# Altium footprint library M_Derogarian Altium Library.PcbLib: 137 footprints (part 1 of 9)
Each footprint in its own frame and in the unit in brackets; x right, y up, seen from the top. Pads: shape width x height; smd on the part's side, far side on the other; paste and mask are expansions set on the pad; w line width, h text height; cw(c..) or ccw(c..) is an arc to the next point about the centre after c.
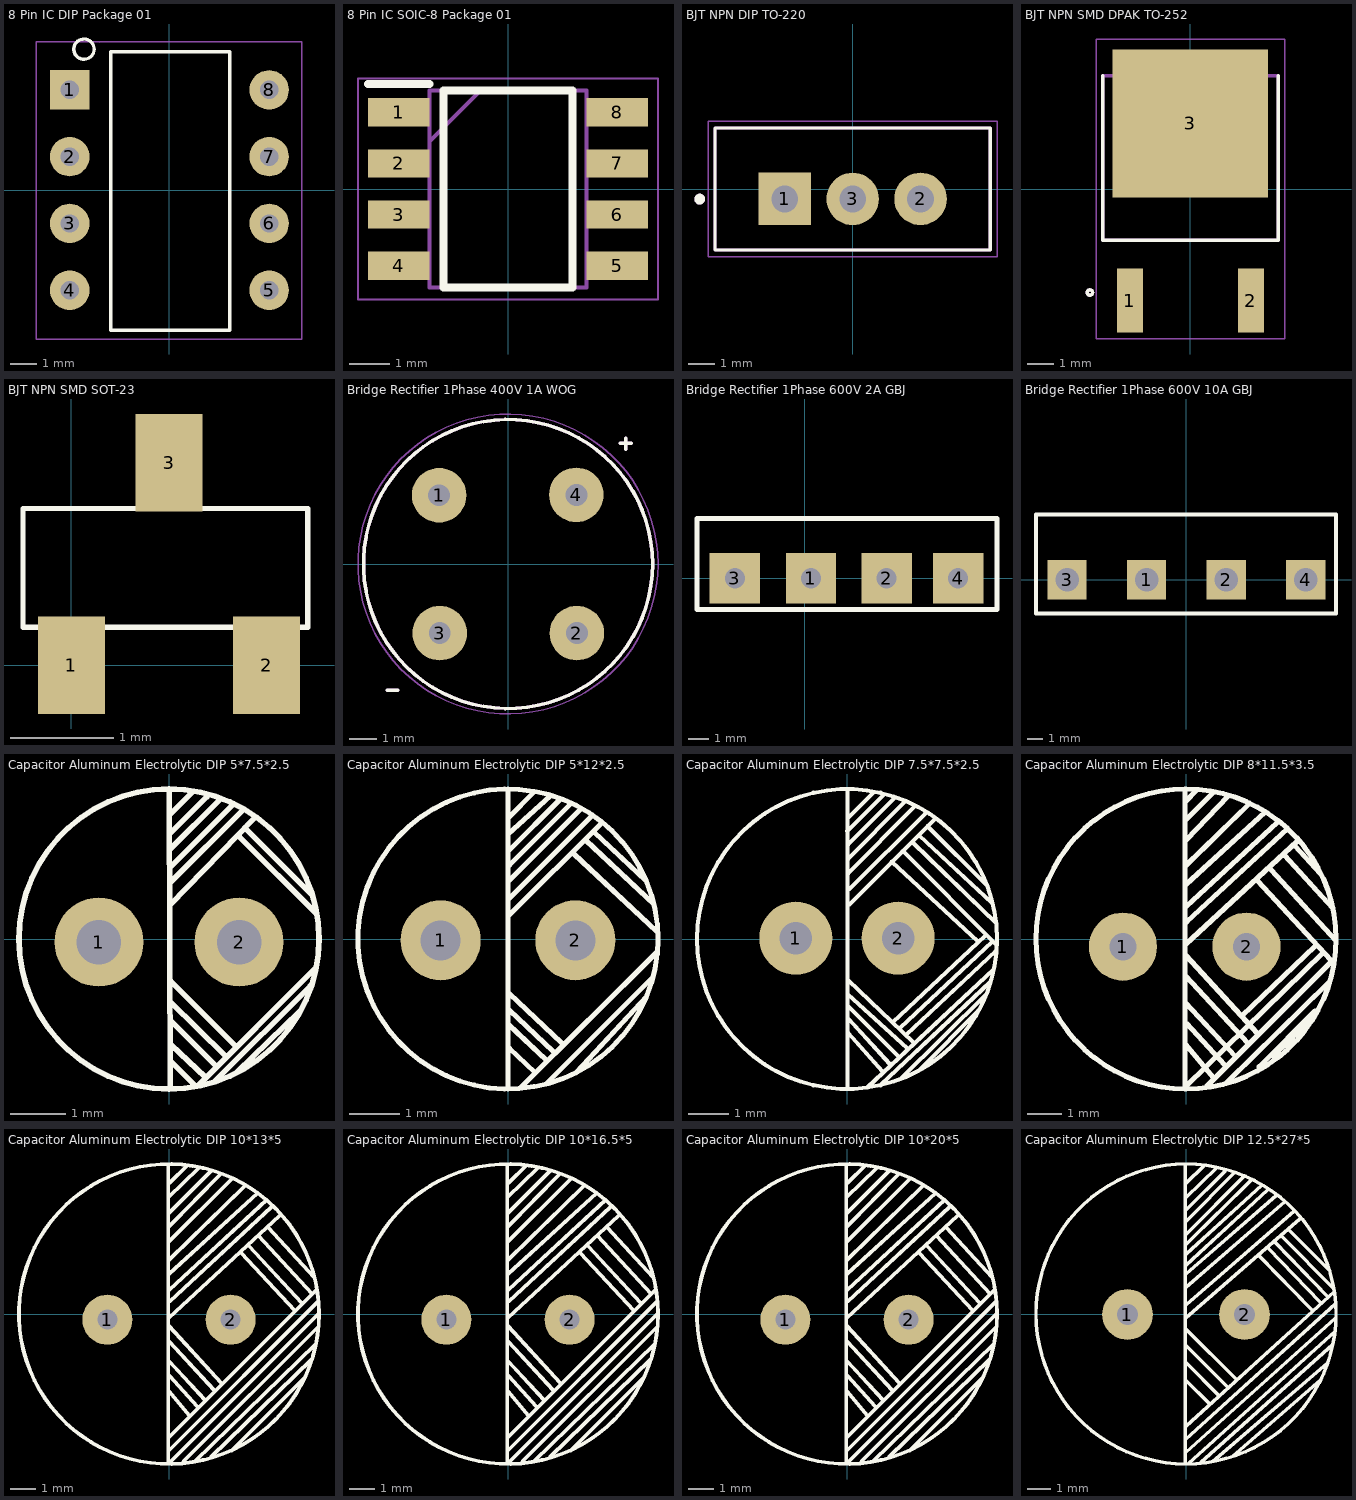
[diagram p0: the footprints below, top view; thin cyan lines are the x and y axes]

## 8 Pin IC DIP Package 01 [mm]
pads (8):
  rect 1.5x1.5 hole 0.7: 1(-3.793,3.81)
  round 1.5 hole 0.7: 2(-3.793,1.27) 3(-3.793,-1.27) 4(-3.793,-3.81) 5(3.793,-3.81) 6(3.793,-1.27) 7(3.793,1.27) 8(3.793,3.81)
Top Overlay:
  circle w0.127: c-3.251,5.359 r0.386
  lines w0.127: 2.269,-5.334 -2.227,-5.334 -2.227,5.258 2.294,5.258 2.294,-5.334
Mechanical 15:
  lines w0.05: -2.674,5.623 -2.659,5.639 ; -5.072,-5.664 5.037,-5.664 5.037,5.639 -5.072,5.639 -5.072,-5.664
3D body "User Library-DIP-8P-M01.STEP": height 4.86, standoff -2.5, extent -3.912,-4.598 3.958,4.802

## 8 Pin IC SOIC-8 Package 01 [mm]
pads (8):
  rect 1.525x0.7 smd: 1(-2.712,1.905) 2(-2.712,0.635) 3(-2.712,-0.635) 4(-2.712,-1.905) 5(2.712,-1.905) 6(2.712,-0.635) 7(2.712,0.635) 8(2.712,1.905)
Top Overlay:
  lines w0.2: -3.475,2.605 -1.95,2.605 ; -1.6,-2.45 1.6,-2.45 1.6,2.45 -1.6,2.45 -1.6,-2.45
Mechanical 13:
  lines w0.05: -3.725,-2.75 3.725,-2.75 3.725,2.75 -3.725,2.75 -3.725,-2.75
  lines w0.1: -1.95,1.18 -0.68,2.45 ; -1.95,-2.45 1.95,-2.45 1.95,2.45 -1.95,2.45 -1.95,-2.45
3D body "User Library-SOIC8_4_9x3_9_1_53_p1_27.STEP": height 1.55, standoff -0.11, extent -3,-2.45 3,2.45

## BJT NPN DIP TO-220 [mm]
pads (3):
  rect 1.965x1.965 hole 1: 1(-2.54,-0.373)
  round 1.965 hole 1: 2(2.54,-0.373) 3(0,-0.373)
Top Overlay:
  circle w0.2: c-5.726,-0.377 r0.1
  lines w0.127: -5.152,-2.282 5.152,-2.282 5.152,2.282 -5.152,2.282 -5.152,-2.282
Mechanical 13:
  circle w0.2: c-5.726,-0.377 r0.1
  lines w0.127: -5.152,-2.282 5.152,-2.282 5.152,2.282 -5.152,2.282 -5.152,-2.282
Mechanical 15:
  lines w0.05: -5.403,-2.532 -5.403,2.532 5.403,2.532 5.403,-2.532 -5.403,-2.532
3D body "STP03D200.STEP": height 22.22, standoff -8.36, extent -5.201,-2.261 5.099,2.311

## BJT NPN SMD DPAK TO-252 [mm]
pads (3):
  rect 0.98x2.4 smd: 1(-2.28,-4.2) 2(2.28,-4.2)
  rect 5.86x5.57 smd paste-4: 3(0,2.47)
Top Overlay:
  circle w0.127: c-3.786,-3.9 r0.1
  lines w0.127: -3.3,4.27 -3.3,-1.93 3.3,-1.93 3.3,4.27
Mechanical 13:
  circle w0.127: c-3.786,-3.9 r0.1
  lines w0.127: -3.3,-1.93 -3.3,4.27 3.3,4.27 3.3,-1.93 -3.3,-1.93
Mechanical 15:
  lines w0.05: -3.55,-5.65 3.55,-5.65 3.55,5.65 -3.55,5.65 -3.55,-5.65
3D body "2STD1665T4.STEP": height 2.17, standoff -0.23, extent -3.25,-4.87 3.25,4.855

## BJT NPN SMD SOT-23 [mm]
pads (3):
  rect 0.65x0.95 smd mask+0.08: 1(0,0) 2(1.9,0) 3(0.95,1.97)
Top Overlay:
  lines w0.05: -0.47,0.37 2.3,0.37 2.3,1.525 -0.47,1.525 -0.47,0.37
3D body "User Library-SOT23-9.STEP": height 1.11, standoff 0.01, extent -0.488,-0.195 2.412,2.205

## Bridge Rectifier 1Phase 400V 1A WOG [mm]
pads (4):
  round 2 hole 0.8: 1(-2.527,2.521) 2(2.527,-2.534) 3(-2.502,-2.534) 4(2.507,2.534)
Top Overlay:
  circle w0.127: c0,0 r5.3
  lines w0.127: -4.433,-4.629 -4.033,-4.629 ; 4.121,4.42 4.521,4.42 ; 4.319,4.213 4.319,4.613
Mechanical 13:
  circle w0.127: c0,0 r5.3
  lines w0.127: -4.433,-4.629 -4.033,-4.629 ; 4.121,4.42 4.521,4.42 ; 4.318,4.213 4.318,4.613
Mechanical 15:
  circle w0.05: c0,0 r5.5
3D body "User Library-WOB-1.STEP": height 7.6, standoff -1.5, extent -4.637,-4.669 4.663,4.631

## Bridge Rectifier 1Phase 600V 2A GBJ [mm]
pads (4):
  rect 2.5x2.5 hole 1: 1(0.305,0) 2(4.064,0) 3(-3.48,0) 4(7.62,0)
Top Overlay:
  lines w0.254: -5.359,-1.549 -5.359,2.972 9.55,2.972 9.55,-1.549 -5.359,-1.549
3D body "User Library-Silicon Bridge Rectifiers KBP06.STEP": height 15.68, standoff -16.67, extent -5.191,-1.256 9.559,2.794

## Bridge Rectifier 1Phase 600V 10A GBJ [mm]
pads (4):
  rect 2.5x2.5 hole 1.5: 1(-2.54,0) 2(2.54,0) 3(-7.62,0) 4(7.62,0)
Top Overlay:
  lines w0.254: -9.601,-2.159 9.55,-2.159 9.55,4.166 -9.601,4.166 -9.601,-2.159
3D body "User Library-KBL-1.STEP": height 16.75, standoff -3.5, extent -9.5,-2.235 9.5,4.015

## Capacitor Aluminum Electrolytic DIP 5*7.5*2.5 [mm]
height 12
pads (2):
  round 1.6 hole 0.8: 1(-1.263,-0.057) 2(1.263,-0.057)
Top Overlay:
  circle w0.1: c0,0 r2.7
  lines w0.1: 0.007,2.667 0.025,-2.692 ; 0.013,1.003 1.346,2.337 ; 0.014,1.612 0.914,2.515 ; 0.018,0.616 1.549,2.184 ; 0.018,2.242 0.438,2.661 ; 0.019,-1.455 0.857,-2.293 ; 0.019,-1.125 1.016,-2.108 ; 0.019,-0.744 1.2,-1.925 ; 0.025,1.295 1.168,2.438 ; 0.025,1.905 0.686,2.565 ; 0.044,-2.217 0.476,-2.648 ; 0.044,-1.912 0.645,-2.478 ; 0.527,-2.635 2.622,-0.539 ; 0.831,-2.559 2.546,-0.844 ; 1.225,-2.392 2.362,-1.295 ; 1.264,1.847 2.647,0.463 ; 1.365,1.999 2.571,0.793
3D body "User Library-CAPAER_D050_L080_P025_W005X030.STEP": height 8.01, standoff -3, extent -2.48,-2.663 2.53,2.337

## Capacitor Aluminum Electrolytic DIP 5*12*2.5 [mm]
height 12
pads (2):
  round 1.6 hole 0.8: 1(-1.346,-0.025) 2(1.346,-0.025)
Top Overlay:
  circle w0.1: c0,0 r3
  lines w0.1: 0,-2.997 0,2.997 ; 0,-1.702 0.772,-2.427 ; 0,0.457 1.872,2.319 ; 0.004,2.102 0.844,2.861 ; 0.011,2.428 0.517,2.937 ; 0.013,0.8 1.689,2.476 ; 0.024,-1.092 1.073,-2.078 ; 0.025,-2.184 0.538,-2.666 ; 0.025,-1.422 0.903,-2.248 ; 0.025,1.168 1.46,2.603 ; 0.025,1.473 1.257,2.705 ; 0.025,1.778 1.029,2.781 ; 0.254,-2.972 2.979,-0.262 ; 0.762,-2.896 2.896,-0.762 ; 1.321,1.702 2.973,0.15 ; 1.372,-2.667 2.774,-1.148 ; 1.549,1.981 2.924,0.69 ; 1.727,2.134 2.762,1.162
3D body "User Library-CAPAER_D063_L125_P025_W005X030.STEP": height 12.51, standoff -3, extent -3.18,-3.176 3.13,3.124

## Capacitor Aluminum Electrolytic DIP 7.5*7.5*2.5 [mm]
height 12
pads (2):
  round 1.8 hole 0.8: 1(-1.263,0.019) 2(1.263,0.019)
Top Overlay:
  circle w0.1: c0,0 r3.7
  lines w0.1: 0.007,2.66 0.895,3.55 ; 0.007,-3.658 0.007,3.658 ; 0.018,1.607 1.651,3.251 ; 0.018,1.962 1.409,3.366 ; 0.018,2.318 1.174,3.474 ; 0.025,-2.311 0.873,-3.268 ; 0.025,-1.956 1.067,-3.099 ; 0.025,-1.651 1.27,-2.896 ; 0.025,-1.372 1.479,-2.689 ; 0.025,-1.016 1.642,-2.55 ; 0.044,0.845 2.165,2.966 ; 0.044,1.226 1.93,3.099 ; 0.044,3.004 0.666,3.626 ; 0.505,-3.657 3.618,-0.749 ; 0.843,-3.586 3.531,-1.067 ; 1.104,1.905 3.233,-0.066 ; 1.117,-2.057 3.415,0.089 ; 1.309,-2.197 3.592,-0.063 ; 1.316,-3.45 3.429,-1.372 ; 1.375,2.171 3.691,-0.144 ; 1.463,-2.353 3.669,-0.292 ; 1.629,2.375 3.683,0.381 ; 1.782,2.552 3.581,0.889 ; 1.796,-3.219 3.25,-1.752 ; 1.985,2.781 3.45,1.316
3D body "User Library-CAPAER_D063_L075_P025_W005X030.STEP": height 7.51, standoff -3, extent -3.206,-3.175 3.104,3.125

## Capacitor Aluminum Electrolytic DIP 8*11.5*3.5 [mm]
height 12
pads (2):
  round 2 hole 0.8: 1(-1.85,-0.225) 2(1.775,-0.225)
Top Overlay:
  circle w0.15: c0,0 r4.4
  lines w0.15: -0.025,-4.4 -0.025,4.4 ; -0.022,3.476 0.8,4.3 ; -0.014,-0.167 3.272,2.872 ; -0.01,-3.084 0.813,-4.064 ; -0.01,-1.865 1.444,-3.437 ; -0.01,-1.078 1.821,-3.057 ; -0.003,4.042 0.298,4.353 ; 0,-0.483 2.102,-2.773 ; 0,1.6 2.326,3.722 ; 0,2.159 1.868,3.982 ; 0,2.896 1.25,4.2 ; 0.008,0.957 2.674,3.422 ; 0.016,-2.475 1.143,-3.708 ; 0.02,-4.294 4.025,-0.4 ; 0.027,0.507 2.982,3.24 ; 0.601,-4.326 4.314,-0.614 ; 1.2,-4.2 4.206,-1.255 ; 1.639,-2.263 3.8,-0.2 ; 2.097,1.714 4.257,-0.622 ; 2.147,-3.747 3.784,-2.11 ; 2.5,2.025 4.4,-0.05 ; 2.548,-3.449 3.6,-2.425 ; 2.886,2.453 4.306,0.905 ; 3.191,2.732 3.944,1.918
3D body "User Library-Cap-EL(8x11_5-3_5).STEP": height 11.5, standoff -3.3, extent -4.1,-4.198 3.902,3.798

## Capacitor Aluminum Electrolytic DIP 10*13*5 [mm]
height 12
pads (2):
  round 2 hole 0.8: 1(-2.464,-0.229) 2(2.464,-0.229)
Top Overlay:
  circle w0.15: c0,0 r6
  lines w0.15: -0.025,-5.918 -0.025,5.944 ; -0.022,4.671 1.179,5.832 ; -0.022,3.476 2.057,5.588 ; -0.014,-0.167 4.434,3.947 ; -0.013,-5.474 5.944,0.483 ; -0.013,-4.94 5.893,0.965 ; -0.01,-3.084 0.813,-4.064 ; -0.01,-1.865 1.444,-3.437 ; -0.01,-1.078 1.821,-3.057 ; -0.003,4.042 1.702,5.74 ; 0,-0.483 2.102,-2.773 ; 0,1.6 3.547,4.836 ; 0,2.159 3.033,5.121 ; 0,2.896 2.527,5.423 ; 0.008,0.957 3.901,4.556 ; 0.013,-5.956 5.969,0 ; 0.016,-2.475 1.143,-3.708 ; 0.015,5.242 0.751,5.955 ; 0.027,0.507 4.104,4.277 ; 0.572,-5.905 5.969,-0.508 ; 1.04,-5.892 5.867,-1.194 ; 1.685,-5.722 5.715,-1.803 ; 2.498,-5.47 5.407,-2.562 ; 2.886,2.453 5.033,0.131 ; 3.191,2.732 5.316,0.433 ; 3.572,3.139 5.732,0.803 ; 3.953,3.469 5.819,1.45
3D body "User Library-Cap-EL(10x13-5).STEP": height 13, standoff -3.3, extent -5,-5.296 5.002,4.696

## Capacitor Aluminum Electrolytic DIP 10*16.5*5 [mm]
height 12
pads (2):
  round 2 hole 0.8: 1(-2.464,-0.229) 2(2.464,-0.229)
Top Overlay:
  circle w0.15: c0,0 r6
  lines w0.15: -0.025,-5.918 -0.025,5.944 ; -0.022,4.671 1.179,5.832 ; -0.022,3.476 2.057,5.588 ; -0.014,-0.167 4.434,3.947 ; -0.013,-5.474 5.944,0.483 ; -0.013,-4.94 5.893,0.965 ; -0.01,-3.084 0.813,-4.064 ; -0.01,-1.865 1.444,-3.437 ; -0.01,-1.078 1.821,-3.057 ; -0.003,4.042 1.702,5.74 ; 0,-0.483 2.102,-2.773 ; 0,1.6 3.547,4.836 ; 0,2.159 3.033,5.121 ; 0,2.896 2.527,5.423 ; 0.008,0.957 3.901,4.556 ; 0.013,-5.956 5.969,0 ; 0.016,-2.475 1.143,-3.708 ; 0.015,5.242 0.751,5.955 ; 0.027,0.507 4.104,4.277 ; 0.572,-5.905 5.969,-0.508 ; 1.04,-5.892 5.867,-1.194 ; 1.685,-5.722 5.715,-1.803 ; 2.498,-5.47 5.407,-2.562 ; 2.886,2.453 5.033,0.131 ; 3.191,2.732 5.316,0.433 ; 3.572,3.139 5.732,0.803 ; 3.953,3.469 5.819,1.45
3D body "User Library-CAPAER_D100_L165_P050_W006X030_CAPAER_D100_L165_P050_W006X030.sldprt": height 16.51, standoff -3, extent -5.03,-5.308 4.98,4.689

## Capacitor Aluminum Electrolytic DIP 10*20*5 [mm]
height 12
pads (2):
  round 2 hole 0.8: 1(-2.464,-0.229) 2(2.464,-0.229)
Top Overlay:
  circle w0.15: c0,0 r6
  lines w0.15: -0.025,-5.918 -0.025,5.944 ; -0.022,4.671 1.179,5.832 ; -0.022,3.476 2.057,5.588 ; -0.014,-0.167 4.434,3.947 ; -0.013,-5.474 5.944,0.483 ; -0.013,-4.94 5.893,0.965 ; -0.01,-3.084 0.813,-4.064 ; -0.01,-1.865 1.444,-3.437 ; -0.01,-1.078 1.821,-3.057 ; -0.003,4.042 1.702,5.74 ; 0,-0.483 2.102,-2.773 ; 0,1.6 3.547,4.836 ; 0,2.159 3.033,5.121 ; 0,2.896 2.527,5.423 ; 0.008,0.957 3.901,4.556 ; 0.013,-5.956 5.969,0 ; 0.016,-2.475 1.143,-3.708 ; 0.015,5.242 0.751,5.955 ; 0.027,0.507 4.104,4.277 ; 0.572,-5.905 5.969,-0.508 ; 1.04,-5.892 5.867,-1.194 ; 1.685,-5.722 5.715,-1.803 ; 2.498,-5.47 5.407,-2.562 ; 2.886,2.453 5.033,0.131 ; 3.191,2.732 5.316,0.433 ; 3.572,3.139 5.732,0.803 ; 3.953,3.469 5.819,1.45
3D body "User Library-Cap-EL(10x20-5).STEP": height 20, standoff -3.3, extent -5.025,-5.25 4.977,4.75

## Capacitor Aluminum Electrolytic DIP 12.5*27*5 [mm]
height 12
pads (2):
  round 2.2 hole 0.9: 1(-2.536,-0.022) 2(2.536,-0.022)
Top Overlay:
  circle w0.15: c0,0 r6.5
  lines w0.15: -0.025,-6.477 -0.025,6.477 ; -0.026,-2.845 1.041,-3.912 ; -0.018,2.1 3.535,5.384 ; -0.013,3.442 2.527,5.982 ; -0.011,5.039 1.333,6.338 ; -0.005,-5.425 6.477,0.432 ; -0.003,-0.17 4.937,4.116 ; -0.003,1.15 4.279,4.867 ; 0,-5.994 6.477,-0.178 ; 0,-0.66 2.172,-2.832 ; 0.001,-4.852 6.426,0.965 ; 0.005,3.017 2.816,5.794 ; 0.006,1.746 3.912,5.131 ; 0.01,4.512 1.702,6.198 ; 0.012,2.603 3.281,5.583 ; 0.015,5.674 0.779,6.413 ; 0.016,4.022 2.083,6.121 ; 0.022,0.414 4.686,4.46 ; 0.025,-2.134 1.41,-3.518 ; 0.025,-1.397 1.803,-3.175 ; 0.113,-6.462 6.459,-0.742 ; 0.644,-6.436 6.35,-1.321 ; 1.16,-6.387 6.121,-2.134 ; 2.019,-6.161 5.829,-2.855 ; 3.175,2.515 5.442,0.185 ; 3.556,2.845 5.823,0.515 ; 3.835,3.124 6.14,0.754 ; 4.162,3.349 6.41,1.101 ; 4.47,3.632 6.223,1.88
3D body "User Library-CAP_Electrolytic_10X20.STEP": height 20.1, standoff -4.72, extent -5.025,-4.968 4.975,5.026